# Altium schematic symbol library LTSpiceLibrary.SchLib: 776 symbols (part 1 of 3) (continued)
## LT1001S8 (continued)
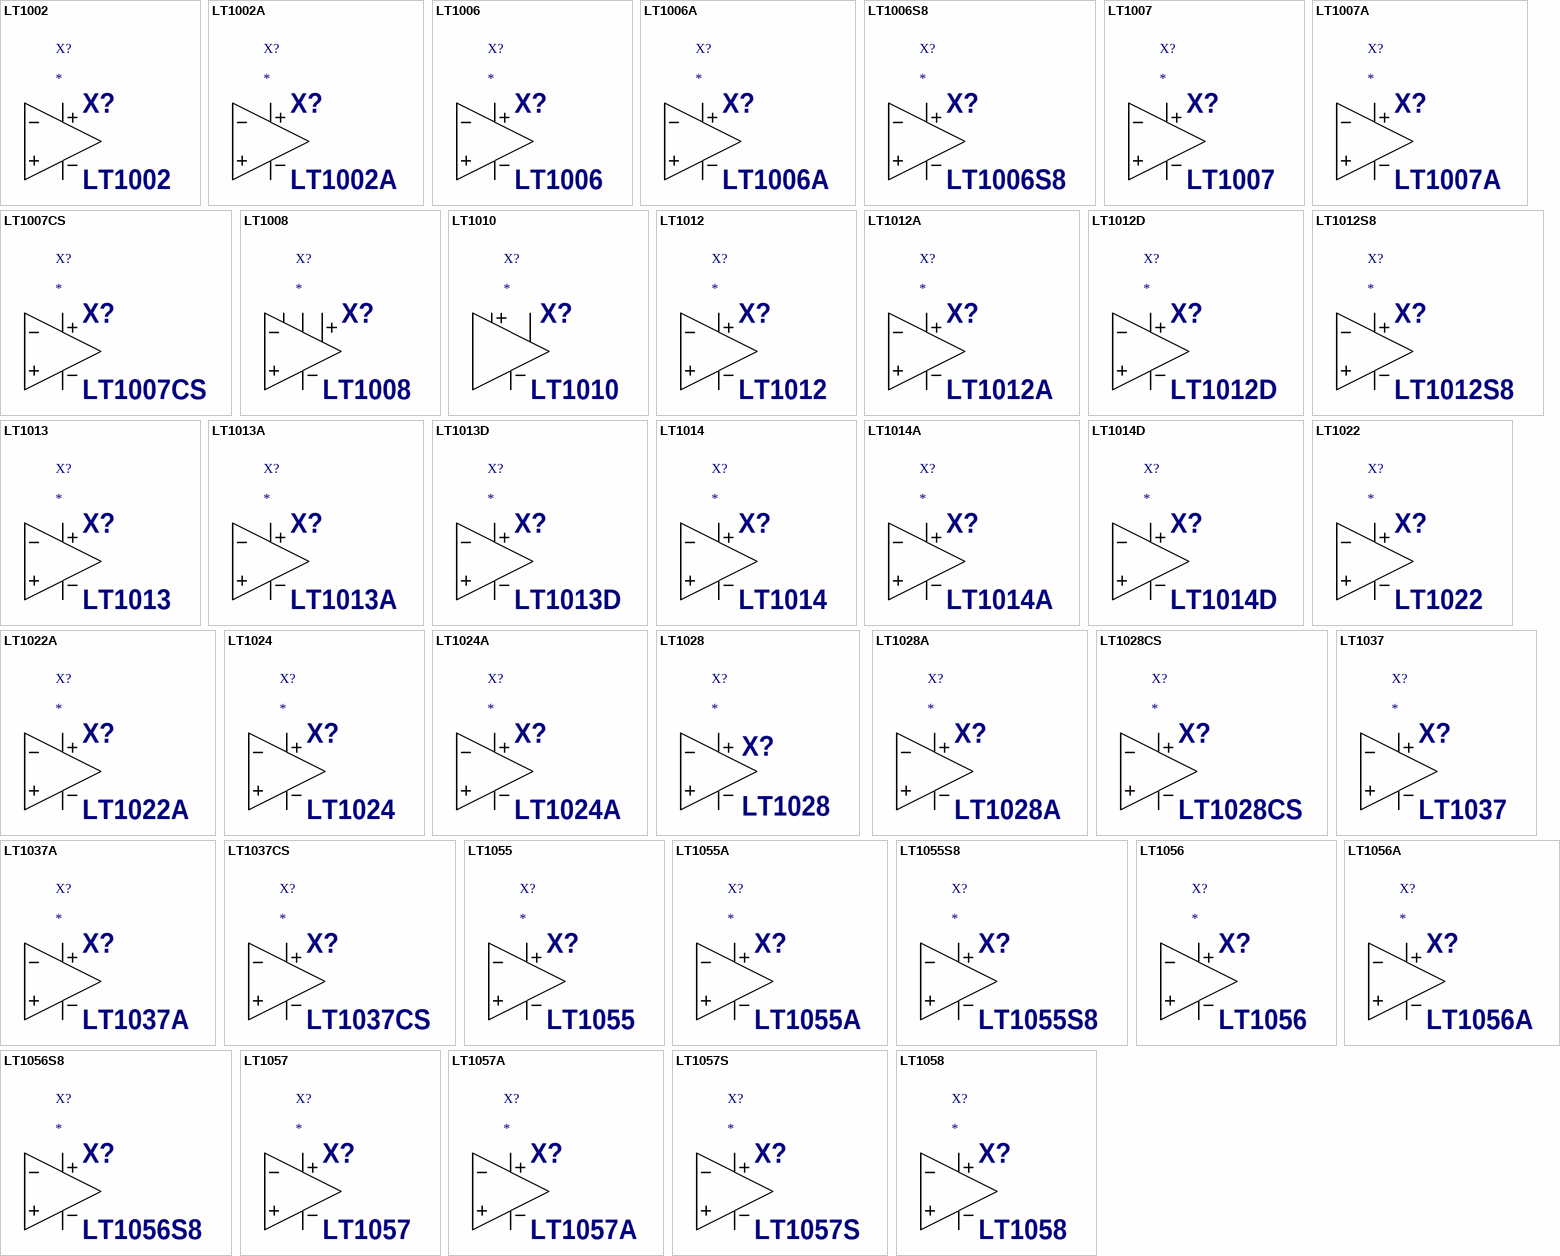
[diagram p6: symbols LT1002 to LT1058]

## LT1002
designator X?  value LT1002  InstName: X?
Prefix: X; Value2: LT1001; Description: Precision Operational Amplifier; SpiceModel: LTC.lib
pins: 1 In+, 2 In-, 3 V+, 4 V-, 5 OUT

## LT1002A
designator X?  value LT1002A  InstName: X?
Prefix: X; Value2: LT1001; Description: Precision Operational Amplifier; SpiceModel: LTC.lib
pins: 1 In+, 2 In-, 3 V+, 4 V-, 5 OUT

## LT1006
designator X?  value LT1006  InstName: X?
Prefix: X; Description: Precision Single Supply Operational Amplifier; SpiceModel: LTC.lib; Value2: LT1006
pins: 1 In+, 2 In-, 3 V+, 4 V-, 5 OUT

## LT1006A
designator X?  value LT1006A  InstName: X?
Prefix: X; Value2: LT1006; Description: Precision Single Supply Operational Amplifier; SpiceModel: LTC.lib
pins: 1 In+, 2 In-, 3 V+, 4 V-, 5 OUT

## LT1006S8
designator X?  value LT1006S8  InstName: X?
Prefix: X; Value2: LT1006; Description: Precision Single Supply Operational Amplifier; SpiceModel: LTC.lib
pins: 1 In+, 2 In-, 3 V+, 4 V-, 5 OUT

## LT1007
designator X?  value LT1007  InstName: X?
Prefix: X; Description: Low noise, High Speed Precision Operational Amplifier; SpiceModel: LTC.lib; Value2: LT1007
pins: 1 In+, 2 In-, 3 V+, 4 V-, 5 OUT

## LT1007A
designator X?  value LT1007A  InstName: X?
Prefix: X; Value2: LT1007; Description: Low noise, High Speed Precision Operational Amplifier; SpiceModel: LTC.lib
pins: 1 In+, 2 In-, 3 V+, 4 V-, 5 OUT

## LT1007CS
designator X?  value LT1007CS  InstName: X?
Prefix: X; Value2: LT1007; Description: Low noise, High Speed Precision Operational Amplifier; SpiceModel: LTC.lib
pins: 1 In+, 2 In-, 3 V+, 4 V-, 5 OUT

## LT1008
designator X?  value LT1008  InstName: X?
Prefix: X; Description: Picoamp Input Current, �Volt Offset, Low Noise Operational Amplifier; SpiceModel: LTC.lib; Value2: LT1008
pins: 1 In+, 2 In-, 3 V+, 4 V-, 5 OUT, 6 COMP1, 7 COMP2

## LT1010
designator X?  value LT1010  InstName: X?
Prefix: X; Description: Fast +/-150mA Power Buffer; SpiceModel: LTC.lib; Value2: LT1010
pins: 1 In, 2 V+, 3 V-, 4 Bias, 5 OUT

## LT1012
designator X?  value LT1012  InstName: X?
Prefix: X; Description: Picoamp Input Current, �Volt Offset, Low noise Operational Amplifier; SpiceModel: LTC.lib; Value2: LT1012
pins: 1 In+, 2 In-, 3 V+, 4 V-, 5 OUT

## LT1012A
designator X?  value LT1012A  InstName: X?
Prefix: X; Value2: LT1012; Description: Picoamp Input Current, �Volt Offset, Low noise Operational Amplifier; SpiceModel: LTC.lib
pins: 1 In+, 2 In-, 3 V+, 4 V-, 5 OUT

## LT1012D
designator X?  value LT1012D  InstName: X?
Prefix: X; Value2: LT1012; Description: Picoamp Input Current, �Volt Offset, Low noise Operational Amplifier; SpiceModel: LTC.lib
pins: 1 In+, 2 In-, 3 V+, 4 V-, 5 OUT

## LT1012S8
designator X?  value LT1012S8  InstName: X?
Prefix: X; Value2: LT1012; Description: Picoamp Input Current, �Volt Offset, Low noise Operational Amplifier; SpiceModel: LTC.lib
pins: 1 In+, 2 In-, 3 V+, 4 V-, 5 OUT

## LT1013
designator X?  value LT1013  InstName: X?
Prefix: X; Description: Dual Precision Operational Amplifier; SpiceModel: LTC.lib; Value2: LT1013
pins: 1 In+, 2 In-, 3 V+, 4 V-, 5 OUT

## LT1013A
designator X?  value LT1013A  InstName: X?
Prefix: X; Value2: LT1013; Description: Dual Precision Operational Amplifier; SpiceModel: LTC.lib
pins: 1 In+, 2 In-, 3 V+, 4 V-, 5 OUT

## LT1013D
designator X?  value LT1013D  InstName: X?
Prefix: X; Value2: LT1013; Description: Dual Precision Operational Amplifier; SpiceModel: LTC.lib
pins: 1 In+, 2 In-, 3 V+, 4 V-, 5 OUT

## LT1014
designator X?  value LT1014  InstName: X?
Prefix: X; Value2: LT1013; Description: Quad Precision Operational Amplifier; SpiceModel: LTC.lib
pins: 1 In+, 2 In-, 3 V+, 4 V-, 5 OUT

## LT1014A
designator X?  value LT1014A  InstName: X?
Prefix: X; Value2: LT1013; Description: Quad Precision Operational Amplifier; SpiceModel: LTC.lib
pins: 1 In+, 2 In-, 3 V+, 4 V-, 5 OUT

## LT1014D
designator X?  value LT1014D  InstName: X?
Prefix: X; Value2: LT1013; Description: Quad Precision Operational Amplifier; SpiceModel: LTC.lib
pins: 1 In+, 2 In-, 3 V+, 4 V-, 5 OUT

## LT1022
designator X?  value LT1022  InstName: X?
Prefix: X; Description: High Speed, Precision JFET Input Operational Amplifier; SpiceModel: LTC.lib; Value2: LT1022
pins: 1 In+, 2 In-, 3 V+, 4 V-, 5 OUT

## LT1022A
designator X?  value LT1022A  InstName: X?
Prefix: X; Value2: LT1022; Description: High Speed, Precision JFET Input Operational Amplifier; SpiceModel: LTC.lib
pins: 1 In+, 2 In-, 3 V+, 4 V-, 5 OUT

## LT1024
designator X?  value LT1024  InstName: X?
Prefix: X; Value2: LT1012; Description: Dual, Matched Picoamp �Volt Input, Low Noise Operational Amplifier; SpiceModel: LTC.lib
pins: 1 In+, 2 In-, 3 V+, 4 V-, 5 OUT

## LT1024A
designator X?  value LT1024A  InstName: X?
Prefix: X; Value2: LT1012; Description: Dual, Matched Picoamp �Volt Input, Low Noise Operational Amplifier; SpiceModel: LTC.lib
pins: 1 In+, 2 In-, 3 V+, 4 V-, 5 OUT

## LT1028
designator X?  value LT1028  InstName: X?
Prefix: X; Description: Ultra-Low Noise Precision High Speed Operational Amplifier; SpiceModel: LTC.lib; Value2: LT1028
pins: 1 In+, 2 In-, 3 V+, 4 V-, 5 OUT

## LT1028A
designator X?  value LT1028A  InstName: X?
Prefix: X; Value2: LT1028; Description: Ultra Low Noise Precision High Speed Operational Amplifier; SpiceModel: LTC.lib
pins: 1 In+, 2 In-, 3 V+, 4 V-, 5 OUT

## LT1028CS
designator X?  value LT1028CS  InstName: X?
Prefix: X; Value2: LT1028; Description: Ultra Low Noise Precision High Speed Operational Amplifier; SpiceModel: LTC.lib
pins: 1 In+, 2 In-, 3 V+, 4 V-, 5 OUT

## LT1037
designator X?  value LT1037  InstName: X?
Prefix: X; Description: Low Noise, High Speed Operational Amplifier; SpiceModel: LTC.lib; Value2: LT1037
pins: 1 In+, 2 In-, 3 V+, 4 V-, 5 OUT

## LT1037A
designator X?  value LT1037A  InstName: X?
Prefix: X; Value2: LT1037; Description: Low Noise, High Speed Operational Amplifier; SpiceModel: LTC.lib
pins: 1 In+, 2 In-, 3 V+, 4 V-, 5 OUT

## LT1037CS
designator X?  value LT1037CS  InstName: X?
Prefix: X; Value2: LT1037; Description: Low Noise, High Speed Operational Amplifier; SpiceModel: LTC.lib
pins: 1 In+, 2 In-, 3 V+, 4 V-, 5 OUT

## LT1055
designator X?  value LT1055  InstName: X?
Prefix: X; Description: Precision, High Speed, JFET Input Operational Amplifier; SpiceModel: LTC.lib; Value2: LT1055
pins: 1 In+, 2 In-, 3 V+, 4 V-, 5 OUT

## LT1055A
designator X?  value LT1055A  InstName: X?
Prefix: X; Value2: LT1055; Description: Precision, High Speed, JFET Input Operational Amplifier; SpiceModel: LTC.lib
pins: 1 In+, 2 In-, 3 V+, 4 V-, 5 OUT

## LT1055S8
designator X?  value LT1055S8  InstName: X?
Prefix: X; Value2: LT1055; Description: Precision, High Speed, JFET Input Operational Amplifier; SpiceModel: LTC.lib
pins: 1 In+, 2 In-, 3 V+, 4 V-, 5 OUT

## LT1056
designator X?  value LT1056  InstName: X?
Prefix: X; Description: Precision, High Speed, JFET Input Operational Amplifier; SpiceModel: LTC.lib; Value2: LT1056
pins: 1 In+, 2 In-, 3 V+, 4 V-, 5 OUT

## LT1056A
designator X?  value LT1056A  InstName: X?
Prefix: X; Value2: LT1056; Description: Precision, High Speed, JFET Input Operational Amplifier; SpiceModel: LTC.lib
pins: 1 In+, 2 In-, 3 V+, 4 V-, 5 OUT

## LT1056S8
designator X?  value LT1056S8  InstName: X?
Prefix: X; Value2: LT1056; Description: Precision, High Speed, JFET Input Operational Amplifier; SpiceModel: LTC.lib
pins: 1 In+, 2 In-, 3 V+, 4 V-, 5 OUT

## LT1057
designator X?  value LT1057  InstName: X?
Prefix: X; Description: Dual JFET Input Precision High Speed Operational Amplifier; SpiceModel: LTC.lib; Value2: LT1057
pins: 1 In+, 2 In-, 3 V+, 4 V-, 5 OUT

## LT1057A
designator X?  value LT1057A  InstName: X?
Prefix: X; Value2: LT1057; Description: Dual JFET Input Precision High Speed Operational Amplifier; SpiceModel: LTC.lib
pins: 1 In+, 2 In-, 3 V+, 4 V-, 5 OUT

## LT1057S
designator X?  value LT1057S  InstName: X?
Prefix: X; Value2: LT1057; Description: Dual JFET Input Precision High Speed Operational Amplifier; SpiceModel: LTC.lib
pins: 1 In+, 2 In-, 3 V+, 4 V-, 5 OUT

## LT1058
designator X?  value LT1058  InstName: X?
Prefix: X; Value2: LT1057; Description: Quad JFET Input Precision High Speed Operational Amplifier; SpiceModel: LTC.lib
pins: 1 In+, 2 In-, 3 V+, 4 V-, 5 OUT

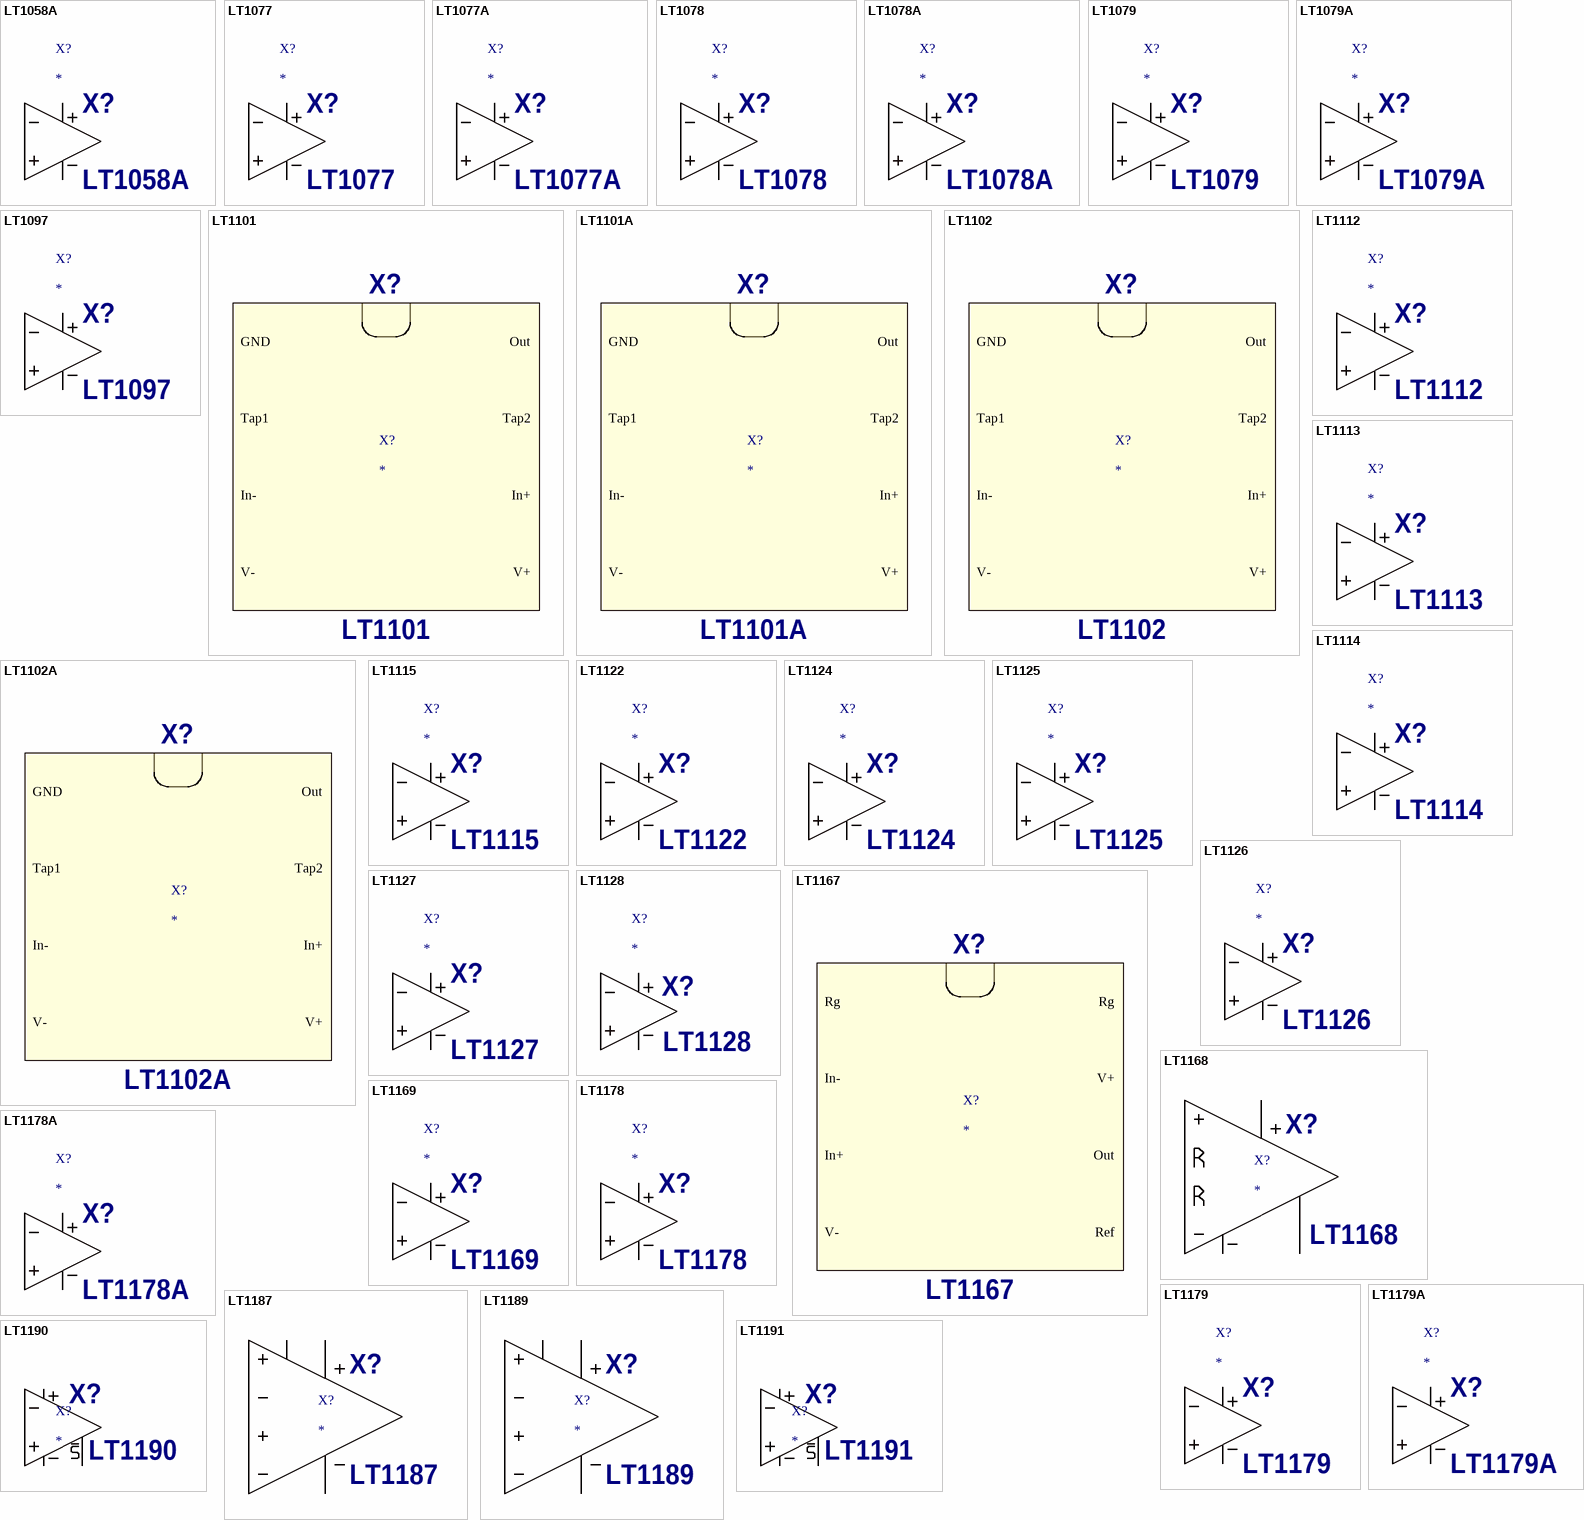
[diagram p7: symbols LT1058A to LT1191]

## LT1058A
designator X?  value LT1058A  InstName: X?
Prefix: X; Value2: LT1057; Description: Quad JFET Input Precision High Speed Operational Amplifier; SpiceModel: LTC.lib
pins: 1 In+, 2 In-, 3 V+, 4 V-, 5 OUT

## LT1077
designator X?  value LT1077  InstName: X?
Prefix: X; Value2: LT1078; Description: �Power, Single Supply, Precision Operational Amplifier; SpiceModel: LTC.lib
pins: 1 In+, 2 In-, 3 V+, 4 V-, 5 OUT

## LT1077A
designator X?  value LT1077A  InstName: X?
Prefix: X; Value2: LT1078; Description: �Power, Single Supply, Precision Operational Amplifier; SpiceModel: LTC.lib
pins: 1 In+, 2 In-, 3 V+, 4 V-, 5 OUT

## LT1078
designator X?  value LT1078  InstName: X?
Prefix: X; Description: �Power, Dual, Single Supply, Precision Operational Amplifier; SpiceModel: LTC.lib; Value2: LT1078
pins: 1 In+, 2 In-, 3 V+, 4 V-, 5 OUT

## LT1078A
designator X?  value LT1078A  InstName: X?
Prefix: X; Value2: LT1078; Description: �Power, Dual, Single Supply, Precision Operational Amplifier; SpiceModel: LTC.lib
pins: 1 In+, 2 In-, 3 V+, 4 V-, 5 OUT

## LT1079
designator X?  value LT1079  InstName: X?
Prefix: X; Value2: LT1078; Description: �Power, Quad, Single Supply, Precision Operational Amplifier; SpiceModel: LTC.lib
pins: 1 In+, 2 In-, 3 V+, 4 V-, 5 OUT

## LT1079A
designator X?  value LT1079A  InstName: X?
Prefix: X; Value2: LT1078; Description: �Power, Quad, Single Supply, Precision Operational Amplifier; SpiceModel: LTC.lib
pins: 1 In+, 2 In-, 3 V+, 4 V-, 5 OUT

## LT1097
designator X?  value LT1097  InstName: X?
Prefix: X; Description: Low Cost, Low Power Precision Operational Amplifier; SpiceModel: LTC.lib; Value2: LT1097
pins: 1 In+, 2 In-, 3 V+, 4 V-, 5 OUT

## LT1101
designator X?  value LT1101  InstName: X?
Prefix: X; Description: Precision, �Power, Single Supply Instrumentation Amplifier(Fixed Gain = 10 or 100); SpiceModel: LTC.lib; Value2: LT1101
pins: 1 GND, 2 Tap1, 3 In-, 4 V-, 5 V+, 6 In+, 7 Tap2, 8 Out

## LT1101A
designator X?  value LT1101A  InstName: X?
Prefix: X; Value2: LT1101; Description: Precision, �Power, Single Supply Instrumentation Amplifier(Fixed Gain = 10 or 100); SpiceModel: LTC.lib
pins: 1 GND, 2 Tap1, 3 In-, 4 V-, 5 V+, 6 In+, 7 Tap2, 8 Out

## LT1102
designator X?  value LT1102  InstName: X?
Prefix: X; Description: High Speed, Precision, JFET Input Instrumentation Amplifier(Fixed Gain = 10 or 100); SpiceModel: LTC.lib; Value2: LT1102
pins: 1 GND, 2 Tap1, 3 In-, 4 V-, 5 V+, 6 In+, 7 Tap2, 8 Out

## LT1102A
designator X?  value LT1102A  InstName: X?
Prefix: X; Value2: LT1102; Description: High Speed, Precision, JFET Input Instrumentation Amplifier(Fixed Gain = 10 or 100); SpiceModel: LTC.lib
pins: 1 GND, 2 Tap1, 3 In-, 4 V-, 5 V+, 6 In+, 7 Tap2, 8 Out

## LT1112
designator X?  value LT1112  InstName: X?
Prefix: X; Description: Dual Low Power Precision, Picoamp Operational Amplifier; SpiceModel: LTC.lib; Value2: LT1112
pins: 1 In+, 2 In-, 3 V+, 4 V-, 5 OUT

## LT1113
designator X?  value LT1113  InstName: X?
Prefix: X; Description: Dual Low Noise, Precision, JFET Input Operational Amplifier; SpiceModel: LTC.lib; Value2: LT1113
pins: 1 In+, 2 In-, 3 V+, 4 V-, 5 OUT

## LT1114
designator X?  value LT1114  InstName: X?
Prefix: X; Value2: LT1112; Description: Quad Low Power Precision, Picoamp Operational Amplifier; SpiceModel: LTC.lib
pins: 1 In+, 2 In-, 3 V+, 4 V-, 5 OUT

## LT1115
designator X?  value LT1115  InstName: X?
Prefix: X; Value2: LT1028; Description: Ultra-Low Noise, Low Distortion, Audio Operational Amplifier; SpiceModel: LTC.lib
pins: 1 In+, 2 In-, 3 V+, 4 V-, 5 OUT

## LT1122
designator X?  value LT1122  InstName: X?
Prefix: X; Description: Fast Settling, JFET Input Operational Amplifier; SpiceModel: LTC.lib; Value2: LT1122
pins: 1 In+, 2 In-, 3 V+, 4 V-, 5 OUT

## LT1124
designator X?  value LT1124  InstName: X?
Prefix: X; Description: Operational Amplifier Dual Low Noise, High Speed Precision Operational Amplifier; SpiceModel: LTC.lib; Value2: LT1124
pins: 1 In+, 2 In-, 3 V+, 4 V-, 5 OUT

## LT1125
designator X?  value LT1125  InstName: X?
Prefix: X; Value2: LT1124; Description: Operational Amplifier Quad Low Noise, High Speed Precision Operational Amplifier; SpiceModel: LTC.lib
pins: 1 In+, 2 In-, 3 V+, 4 V-, 5 OUT

## LT1126
designator X?  value LT1126  InstName: X?
Prefix: X; Description: Dual Decompensated Low Noise High Speed Operational Amplifier; SpiceModel: LTC.lib; Value2: LT1126
pins: 1 In+, 2 In-, 3 V+, 4 V-, 5 OUT

## LT1127
designator X?  value LT1127  InstName: X?
Prefix: X; Value2: LT1126; Description: Quad Decompensated Low Noise High Speed Operational Amplifier; SpiceModel: LTC.lib
pins: 1 In+, 2 In-, 3 V+, 4 V-, 5 OUT

## LT1128
designator X?  value LT1128  InstName: X?
Prefix: X; Description: Ultra-Low Noise Precision High Speed Operational Amplifier; SpiceModel: LTC.lib; Value2: LT1128
pins: 1 In+, 2 In-, 3 V+, 4 V-, 5 OUT

## LT1167
designator X?  value LT1167  InstName: X?
Prefix: X; Description: Single Resistor Gain Programmable, Precision Instrumentation Amplifier; SpiceModel: LTC.lib; Value2: LT1167
pins: 1 Rg, 2 In-, 3 In+, 4 V-, 5 Ref, 6 Out, 7 V+, 8 Rg

## LT1168
designator X?  value LT1168  InstName: X?
Prefix: X; Description: �Power, Single Resistor Gain Programmable, Precision Instrumentation Amplifier; SpiceModel: LTC.lib; Value2: LT1168
pins: 1 RG1, 2 FB, 3 In+, 4 V-, 5 REF, 6 OUT, 7 V+, 8 RG2

## LT1169
designator X?  value LT1169  InstName: X?
Prefix: X; Description: Dual Low Noise, Picoampere Bias Current, JFET Input Operational Amplifier; SpiceModel: LTC.lib; Value2: LT1169
pins: 1 In+, 2 In-, 3 V+, 4 V-, 5 OUT

## LT1178
designator X?  value LT1178  InstName: X?
Prefix: X; Description: 17mA Max, Dual Single Supply Precision Operational Amplifier; SpiceModel: LTC.lib; Value2: LT1178
pins: 1 In+, 2 In-, 3 V+, 4 V-, 5 OUT

## LT1178A
designator X?  value LT1178A  InstName: X?
Prefix: X; Value2: LT1178; Description: 17mA Max, Dual Single Supply Precision Operational Amplifier; SpiceModel: LTC.lib
pins: 1 In+, 2 In-, 3 V+, 4 V-, 5 OUT

## LT1179
designator X?  value LT1179  InstName: X?
Prefix: X; Value2: LT1178; Description: 17mA Max, Quad Single Supply Precision Operational Amplifier; SpiceModel: LTC.lib
pins: 1 In+, 2 In-, 3 V+, 4 V-, 5 OUT

## LT1179A
designator X?  value LT1179A  InstName: X?
Prefix: X; Value2: LT1178; Description: 17mA Max, Quad Single Supply Precision Operational Amplifier; SpiceModel: LTC.lib
pins: 1 In+, 2 In-, 3 V+, 4 V-, 5 OUT

## LT1187
designator X?  value LT1187  InstName: X?
Prefix: X; Description: Low Power Video Difference Amplifier; SpiceModel: LTC.lib; Value2: LT1187
pins: 1 In+, 2 In-, 3 V+, 4 V-, 5 OUT, 6 REF, 7 FB, 8 _SHDN

## LT1189
designator X?  value LT1189  InstName: X?
Prefix: X; Description: Low Power Video Difference Amplifier; SpiceModel: LTC.lib; Value2: LT1189
pins: 1 In+, 2 In-, 3 V+, 4 V-, 5 OUT, 6 REF, 7 FB, 8 _SHDN

## LT1190
designator X?  value LT1190  InstName: X?
Prefix: X; Description: Ultra High Speed Operational Amplifier(Av >= 1); SpiceModel: LTC.lib; Value2: LT1190
pins: 1 In+, 2 In-, 3 V+, 4 V-, 5 OUT, 6 SHDN

## LT1191
designator X?  value LT1191  InstName: X?
Prefix: X; Description: Ultra High Speed Operational Amplifier; SpiceModel: LTC.lib; Value2: LT1191
pins: 1 In+, 2 In-, 3 V+, 4 V-, 5 OUT, 6 SHDN

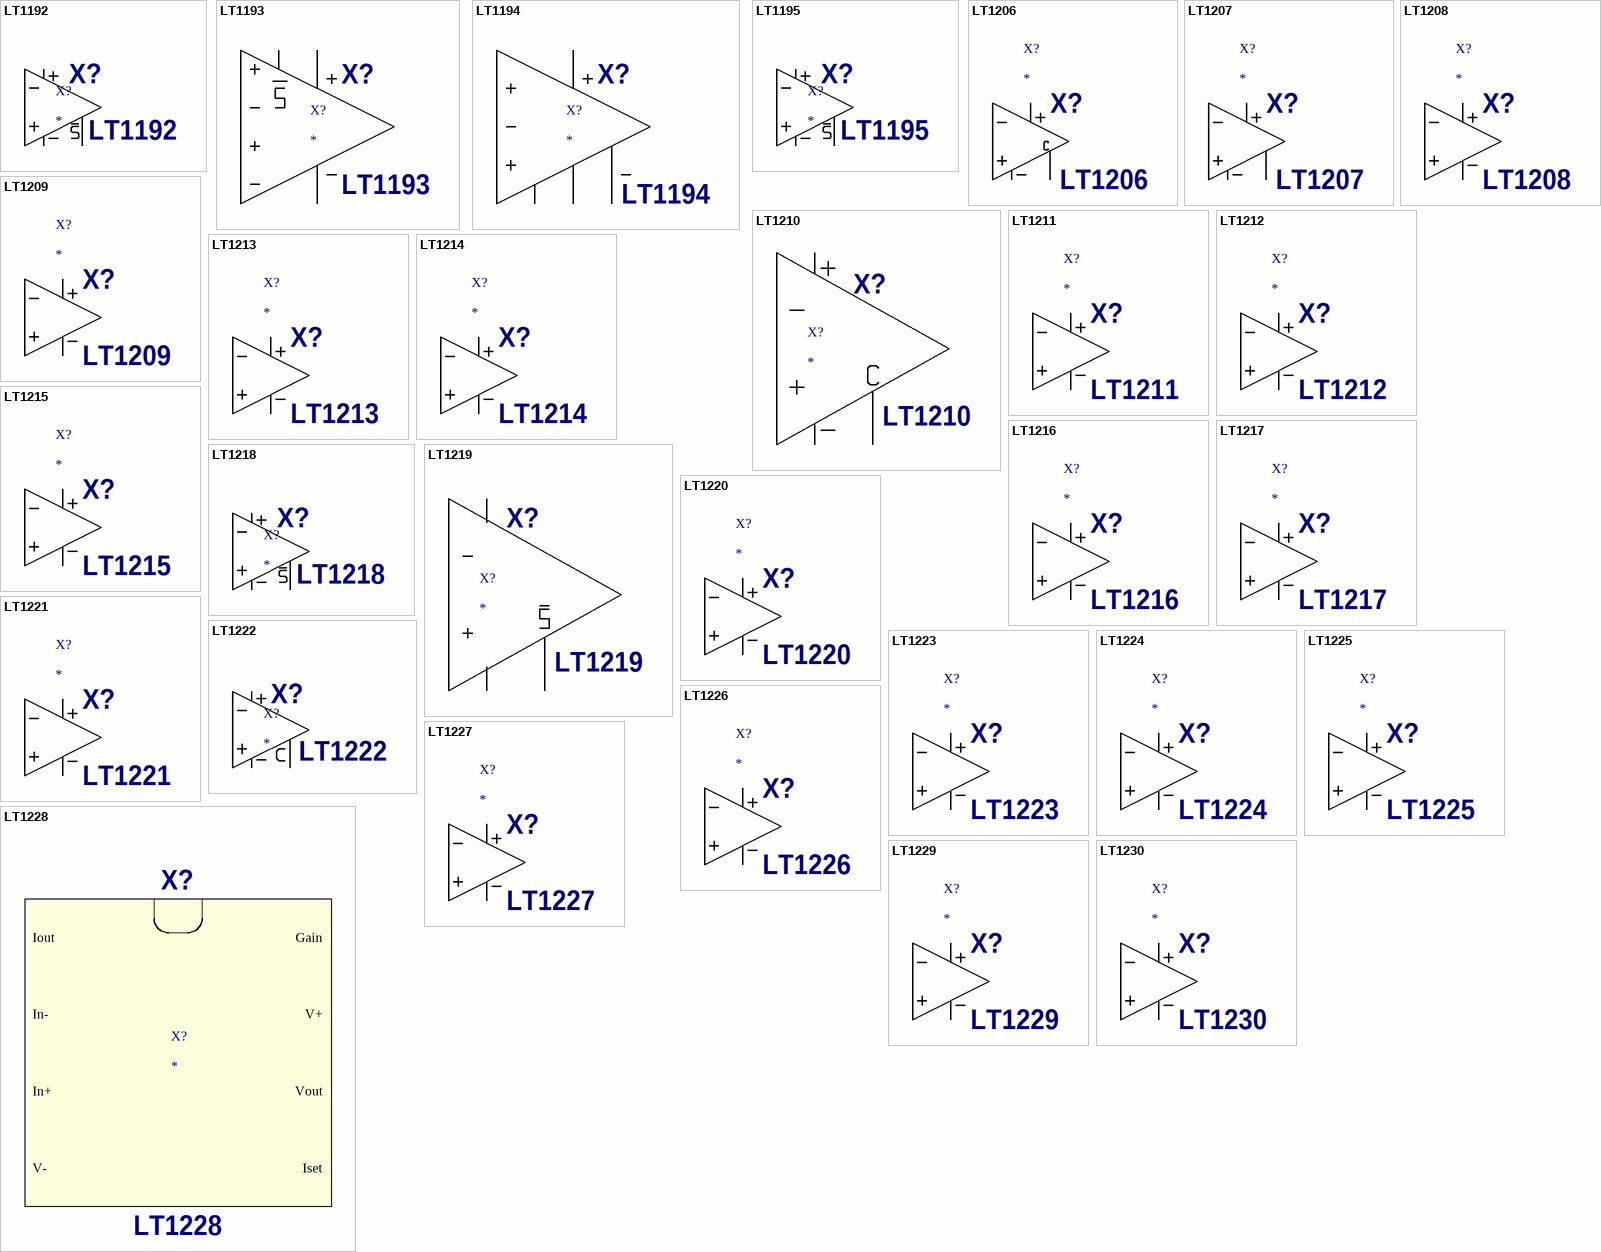
[diagram p8: symbols LT1192 to LT1230]

## LT1192
designator X?  value LT1192  InstName: X?
Prefix: X; Description: Ultra High Speed Operational Amplifier(Av >= 5); SpiceModel: LTC.lib; Value2: LT1192
pins: 1 In+, 2 In-, 3 V+, 4 V-, 5 OUT, 6 SHDN